# Altium footprint library Connectors.PcbLib: 131 footprints (part 4 of 9)
Each footprint in its own frame and in the unit in brackets; x right, y up, seen from the top. Pads: shape width x height; smd on the part's side, far side on the other; paste and mask are expansions set on the pad; w line width, h text height; cw(c..) or ccw(c..) is an arc to the next point about the centre after c.
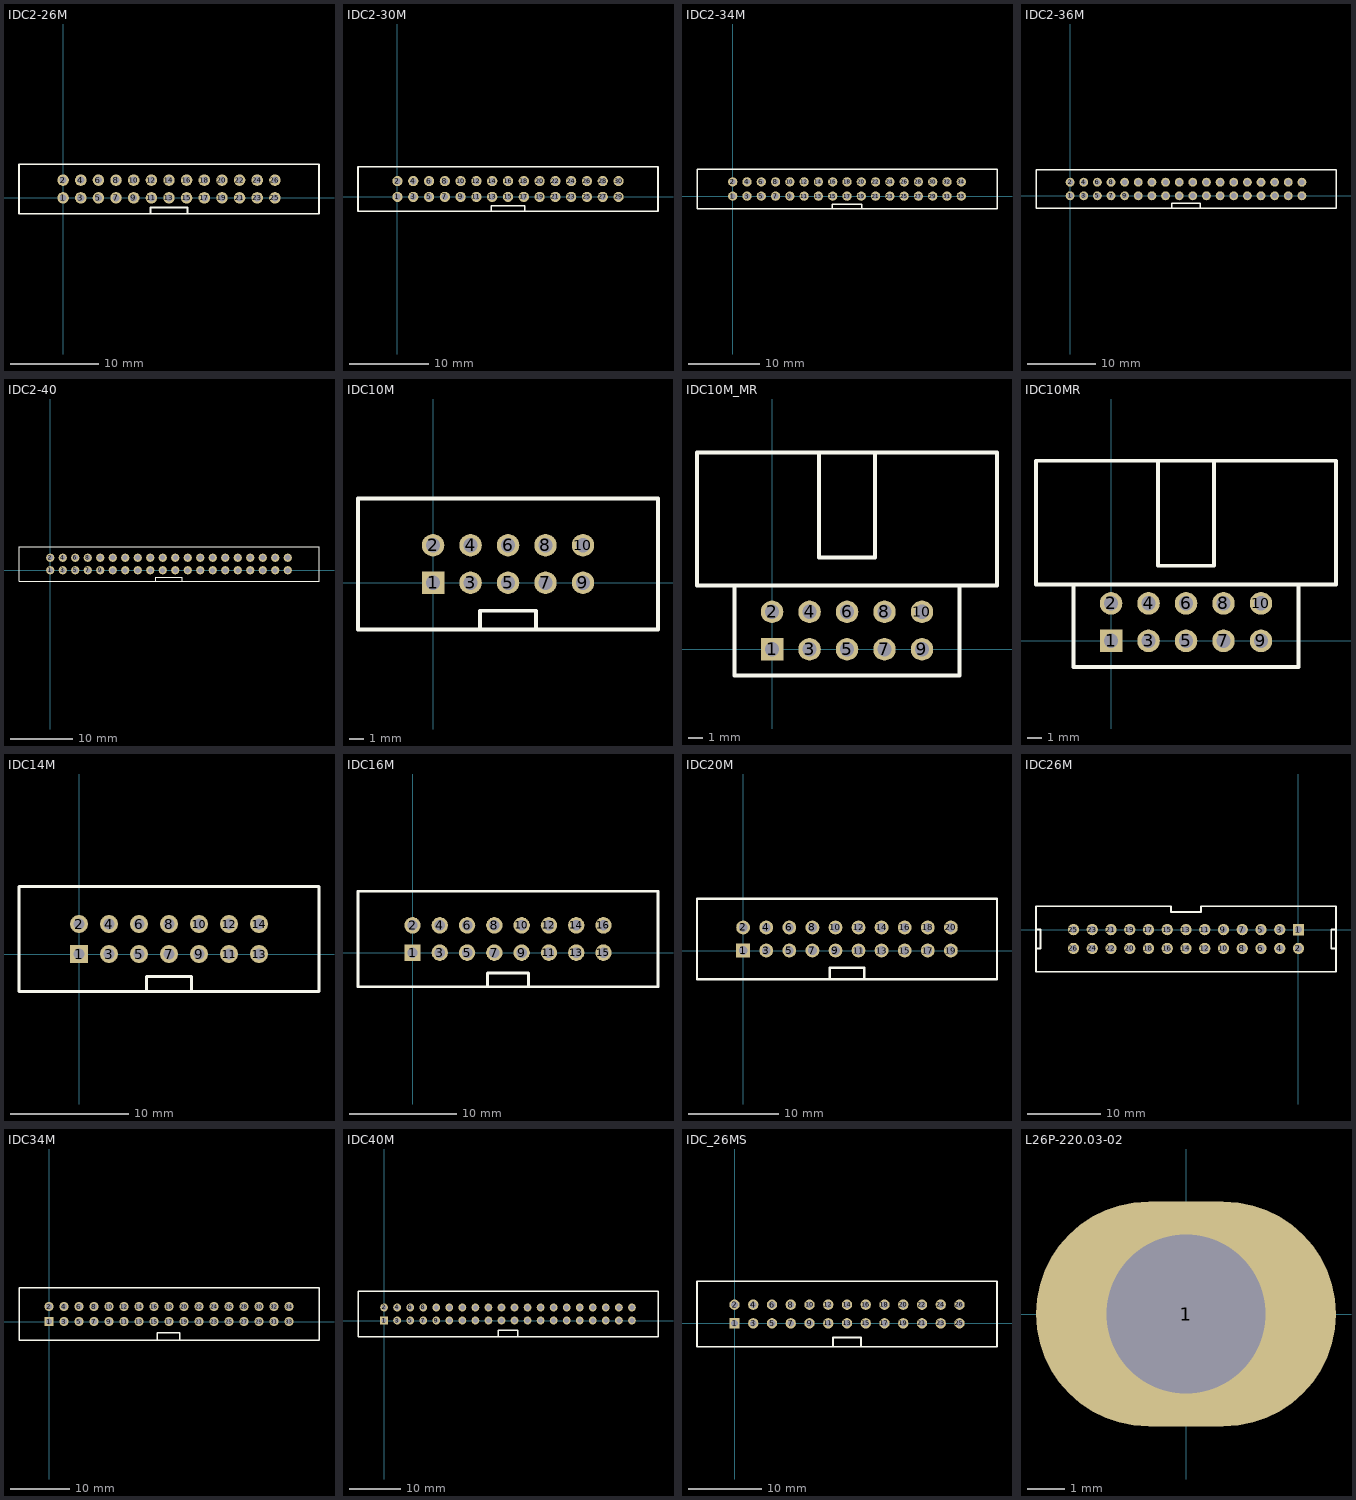
[diagram p3: the footprints below, top view; thin cyan lines are the x and y axes]

## IDC2-26M [mm]
pads (26):
  round 1.3 hole 0.8: 1(0,0) 2(0,2) 3(2,0) 4(2,2) 5(4,0) 6(4,2) 7(6,0) 8(6,2) 9(8,0) 10(8,2) 11(10,0) 12(10,2) 13(12,0) 14(12,2) 15(14,0) 16(14,2) 17(16,0) 18(16,2) 19(18,0) 20(18,2) 21(20,0) 22(20,2) 23(22,0) 24(22,2) 25(24,0) 26(24,2)
Top Overlay:
  lines w0.2: 9.9,-1.8 9.9,-1.1 14.1,-1.1 14.1,-1.8 ; -5,-1.8 29,-1.8 29,3.8 -5,3.8 -5,-1.8
Top Assembly:
  text ".Designator" at 16.998,0.667 h1
3D body "957226-6002-AR.stp": height 5.65, standoff -3, extent -4.6,-1.75 28.6,3.75

## IDC2-30M [mm]
pads (30):
  round 1.3 hole 0.8: 1(0,0) 2(0,2) 3(2,0) 4(2,2) 5(4,0) 6(4,2) 7(6,0) 8(6,2) 9(8,0) 10(8,2) 11(10,0) 12(10,2) 13(12,0) 14(12,2) 15(14,0) 16(14,2) 17(16,0) 18(16,2) 19(18,0) 20(18,2) 21(20,0) 22(20,2) 23(22,0) 24(22,2) 25(24,0) 26(24,2) 27(26,0) 28(26,2) 29(28,0) 30(28,2)
Top Overlay:
  lines w0.2: 11.9,-1.8 11.9,-1.1 16.1,-1.1 16.1,-1.8 ; -5,-1.8 -5,3.8 33,3.8 33,-1.8 -5,-1.8
Top Assembly:
  text ".Designator" at 18.998,0.667 h1
3D body "957230-6002-AR.stp": height 5.68, standoff -2.97, extent -4.6,-1.75 32.6,3.75

## IDC2-34M [mm]
pads (34):
  round 1.3 hole 0.8: 1(0,0) 2(0,2) 3(2,0) 4(2,2) 5(4,0) 6(4,2) 7(6,0) 8(6,2) 9(8,0) 10(8,2) 11(10,0) 12(10,2) 13(12,0) 14(12,2) 15(14,0) 16(14,2) 17(16,0) 18(16,2) 19(18,0) 20(18,2) 21(20,0) 22(20,2) 23(22,0) 24(22,2) 25(24,0) 26(24,2) 27(26,0) 28(26,2) 29(28,0) 30(28,2) 31(30,0) 32(30,2) 33(32,0) 34(32,2)
Top Overlay:
  lines w0.2: 13.9,-1.8 13.9,-1.1 18.1,-1.1 18.1,-1.8 ; -5,-1.8 -5,3.8 37,3.8 37,-1.8 -5,-1.8
Top Assembly:
  text ".Designator" at 20.998,0.667 h1
3D body "957234-6002-AR.stp": height 5.65, standoff -3, extent -4.6,-1.75 36.6,3.75

## IDC2-36M [mm]
pads (36):
  round 1.3 hole 0.8: 1(0,0) 2(0,2) 3(2,0) 4(2,2) 5(4,0) 6(4,2) 7(6,0) 8(6,2) 9(8,0) 10(8,2) 11(10,0) 12(10,2) 13(12,0) 14(12,2) 15(14,0) 16(14,2) 17(16,0) 18(16,2) 19(18,0) 20(18,2) 21(20,0) 22(20,2) 23(22,0) 24(22,2) 25(24,0) 26(24,2) 27(26,0) 28(26,2) 29(28,0) 30(28,2) 31(30,0) 32(30,2) 33(32,0) 34(32,2) 35(34,0) 36(34,2)
Top Overlay:
  lines w0.2: 14.9,-1.8 14.9,-1.1 19.1,-1.1 19.1,-1.8 ; -5,-1.8 39,-1.8 39,3.8 -5,3.8 -5,-1.8
Top Assembly:
  text ".Designator" at 21.998,0.667 h1

## IDC2-40 [mm]
pads (40):
  round 1.3 hole 0.8: 1(0,0) 2(0,2) 3(2,0) 4(2,2) 5(4,0) 6(4,2) 7(6,0) 8(6,2) 9(8,0) 10(8,2) 11(10,0) 12(10,2) 13(12,0) 14(12,2) 15(14,0) 16(14,2) 17(16,0) 18(16,2) 19(18,0) 20(18,2) 21(20,0) 22(20,2) 23(22,0) 24(22,2) 25(24,0) 26(24,2) 27(26,0) 28(26,2) 29(28,0) 30(28,2) 31(30,0) 32(30,2) 33(32,0) 34(32,2) 35(34,0) 36(34,2) 37(36,0) 38(36,2) 39(38,0) 40(38,2)
Top Overlay:
  lines w0.2: 16.9,-1.8 16.9,-1.1 21.1,-1.1 21.1,-1.8 ; -5,-1.8 -5,3.8 43,3.8 43,-1.8 -5,-1.8
Top Assembly:
  text ".Designator" at 23.998,0.667 h1

## IDC10M [mil]
pads (10):
  rect 60x60 hole 38: 1(0,0)
  round 60 hole 38: 2(0,100) 3(100,0) 4(100,100) 5(200,0) 6(200,100) 7(300,0) 8(300,100) 9(400,0) 10(400,100)
Top Overlay:
  lines w10: 125,-125 125,-75 275,-75 275,-125 ; -200,-125 -200,225 600,225 600,-125 -200,-125
Top Assembly:
  text ".Designator" at 396.79,40.45 h39.37
3D body "User Library-BH-10.STEP": height 360.24, standoff -116.14, extent -203.54,-129 603.54,237.14

## IDC10M_MR [mil]
pads (10):
  rect 60x60 hole 38: 1(0,0)
  round 60 hole 38: 2(0,100) 3(100,0) 4(100,100) 5(200,0) 6(200,100) 7(300,0) 8(300,100) 9(400,0) 10(400,100)
Top Overlay:
  lines w10: -100,170 -100,-70 500,-70 500,170 ; 125,525 125,245 275,245 275,525 ; -200,170 -200,525 600,525 600,170 -200,170
Top Assembly:
  text ".Designator" at 396.79,214.38 h39.37

## IDC10MR [mil]
pads (10):
  rect 60x60 hole 38: 1(0,0)
  round 60 hole 38: 2(0,100) 3(100,0) 4(100,100) 5(200,0) 6(200,100) 7(300,0) 8(300,100) 9(400,0) 10(400,100)
Top Overlay:
  lines w10: -100,150 -100,-70 500,-70 500,150 ; 125,480 125,200 275,200 275,480 ; -200,150 -200,480 600,480 600,150 -200,150
Top Assembly:
  text ".Designator" at 396.79,191.88 h39.37
3D body "c-5103311-1-e-3d.stp": height 361.1, standoff -133.9, extent -200.2,-11.81 599.8,478.44

## IDC14M [mil]
pads (14):
  rect 60x60 hole 38: 1(0,0)
  round 60 hole 38: 2(0,100) 3(100,0) 4(100,100) 5(200,0) 6(200,100) 7(300,0) 8(300,100) 9(400,0) 10(400,100) 11(500,0) 12(500,100) 13(600,0) 14(600,100)
Top Overlay:
  lines w10: 225,-125 225,-75 375,-75 375,-125 ; -200,-125 -200,225 800,225 800,-125 -200,-125
Top Assembly:
  text ".Designator" at 496.79,36.88 h39.37

## IDC16M [mil]
pads (16):
  rect 60x60 hole 38: 1(0,0)
  round 60 hole 38: 2(0,100) 3(100,0) 4(100,100) 5(200,0) 6(200,100) 7(300,0) 8(300,100) 9(400,0) 10(400,100) 11(500,0) 12(500,100) 13(600,0) 14(600,100) 15(700,0) 16(700,100)
Top Overlay:
  lines w10: 275,-125 275,-75 425,-75 425,-125 ; -200,-125 -200,225 900,225 900,-125 -200,-125
Top Assembly:
  text ".Designator" at 546.79,36.88 h39.37

## IDC20M [mil]
pads (20):
  rect 60x60 hole 38: 1(0,0)
  round 60 hole 38: 2(0,100) 3(100,0) 4(100,100) 5(200,0) 6(200,100) 7(300,0) 8(300,100) 9(400,0) 10(400,100) 11(500,0) 12(500,100) 13(600,0) 14(600,100) 15(700,0) 16(700,100) 17(800,0) 18(800,100) 19(900,0) 20(900,100)
Top Overlay:
  lines w10: 375,-125 375,-75 525,-75 525,-125 ; -200,-125 1100,-125 1100,225 -200,225 -200,-125
Top Assembly:
  text ".Designator" at 646.79,40.48 h39.37
3D body "User Library-BH-10___64.STEP": height 359.91, standoff -118.11, extent -200.79,-125 1100.79,237.2

## IDC26M [mil]
pads (26):
  rect 60x60 hole 38: 1(0,0)
  round 60 hole 38: 2(0,-100) 3(-100,0) 4(-100,-100) 5(-200,0) 6(-200,-100) 7(-300,0) 8(-300,-100) 9(-400,0) 10(-400,-100) 11(-500,0) 12(-500,-100) 13(-600,0) 14(-600,-100) 15(-700,0) 16(-700,-100) 17(-800,0) 18(-800,-100) 19(-900,0) 20(-900,-100) 21(-1000,0) 22(-1000,-100) 23(-1100,0) 24(-1100,-100) 25(-1200,0) 26(-1200,-100)
Top Overlay:
  lines w10: -1400,-100 -1375,-100 -1375,0 -1400,0 ; 200,-100 175,-100 175,0 200,0 ; -1400,-225 200,-225 200,125 -520,125 -520,95 -680,95 -680,125 -1400,125 -1400,-225
Top Assembly:
  text ".Designator" at -403.21,-63.12 h39.37

## IDC34M [mil]
pads (34):
  rect 60x60 hole 38: 1(0,0)
  round 60 hole 38: 2(0,100) 3(100,0) 4(100,100) 5(200,0) 6(200,100) 7(300,0) 8(300,100) 9(400,0) 10(400,100) 11(500,0) 12(500,100) 13(600,0) 14(600,100) 15(700,0) 16(700,100) 17(800,0) 18(800,100) 19(900,0) 20(900,100) 21(1000,0) 22(1000,100) 23(1100,0) 24(1100,100) 25(1200,0) 26(1200,100) 27(1300,0) 28(1300,100) 29(1400,0) 30(1400,100) 31(1500,0) 32(1500,100) 33(1600,0) 34(1600,100)
Top Overlay:
  lines w10: 720,-125 720,-75 870,-75 870,-125 ; -200,-125 1800,-125 1800,225 -200,225 -200,-125
Top Assembly:
  text ".Designator" at 996.79,36.88 h39.37

## IDC40M [mil]
pads (40):
  rect 60x60 hole 38: 1(0,0)
  round 60 hole 38: 2(0,100) 3(100,0) 4(100,100) 5(200,0) 6(200,100) 7(300,0) 8(300,100) 9(400,0) 10(400,100) 11(500,0) 12(500,100) 13(600,0) 14(600,100) 15(700,0) 16(700,100) 17(800,0) 18(800,100) 19(900,0) 20(900,100) 21(1000,0) 22(1000,100) 23(1100,0) 24(1100,100) 25(1200,0) 26(1200,100) 27(1300,0) 28(1300,100) 29(1400,0) 30(1400,100) 31(1500,0) 32(1500,100) 33(1600,0) 34(1600,100) 35(1700,0) 36(1700,100) 37(1800,0) 38(1800,100) 39(1900,0) 40(1900,100)
Top Overlay:
  lines w10: 875,-125 875,-75 1025,-75 1025,-125 ; -200,-125 2100,-125 2100,225 -200,225 -200,-125
Top Assembly:
  text ".Designator" at 1146.79,36.88 h39.37

## IDC_26MS [mm]
pads (26):
  rect 1.4x1.4 hole 0.9: 1(0,0)
  round 1.4 hole 0.9: 2(0,2.54) 3(2.54,0) 4(2.54,2.54) 5(5.08,0) 6(5.08,2.54) 7(7.62,0) 8(7.62,2.54) 9(10.16,0) 10(10.16,2.54) 11(12.7,0) 12(12.7,2.54) 13(15.24,0) 14(15.24,2.54) 15(17.78,0) 16(17.78,2.54) 17(20.32,0) 18(20.32,2.54) 19(22.86,0) 20(22.86,2.54) 21(25.4,0) 22(25.4,2.54) 23(27.94,0) 24(27.94,2.54) 25(30.48,0) 26(30.48,2.54)
Top Overlay:
  lines w0.254: 13.335,-3.175 13.335,-1.905 17.145,-1.905 17.145,-3.175 ; -5.08,-3.175 35.56,-3.175 35.56,5.715 -5.08,5.715 -5.08,-3.175
Top Assembly:
  text ".Designator" at 20.238,0.937 h1

## L26P-220.03-02 [mm]
pads (1):
  oval 8x6 hole 4.25: 1(0,0)
Top Assembly:
  text ".Designator" at -4.998,-0.333 h1
3D body "L26P-220.03-02.STEP": height 3.7, standoff -1.3, extent -3,-3 3,3